# Altium footprint library MiscDevices.PcbLib: 251 footprints (part 8 of 16)
Each footprint in its own frame and in the unit in brackets; x right, y up, seen from the top. Pads: shape width x height; smd on the part's side, far side on the other; paste and mask are expansions set on the pad; w line width, h text height; cw(c..) or ccw(c..) is an arc to the next point about the centre after c.
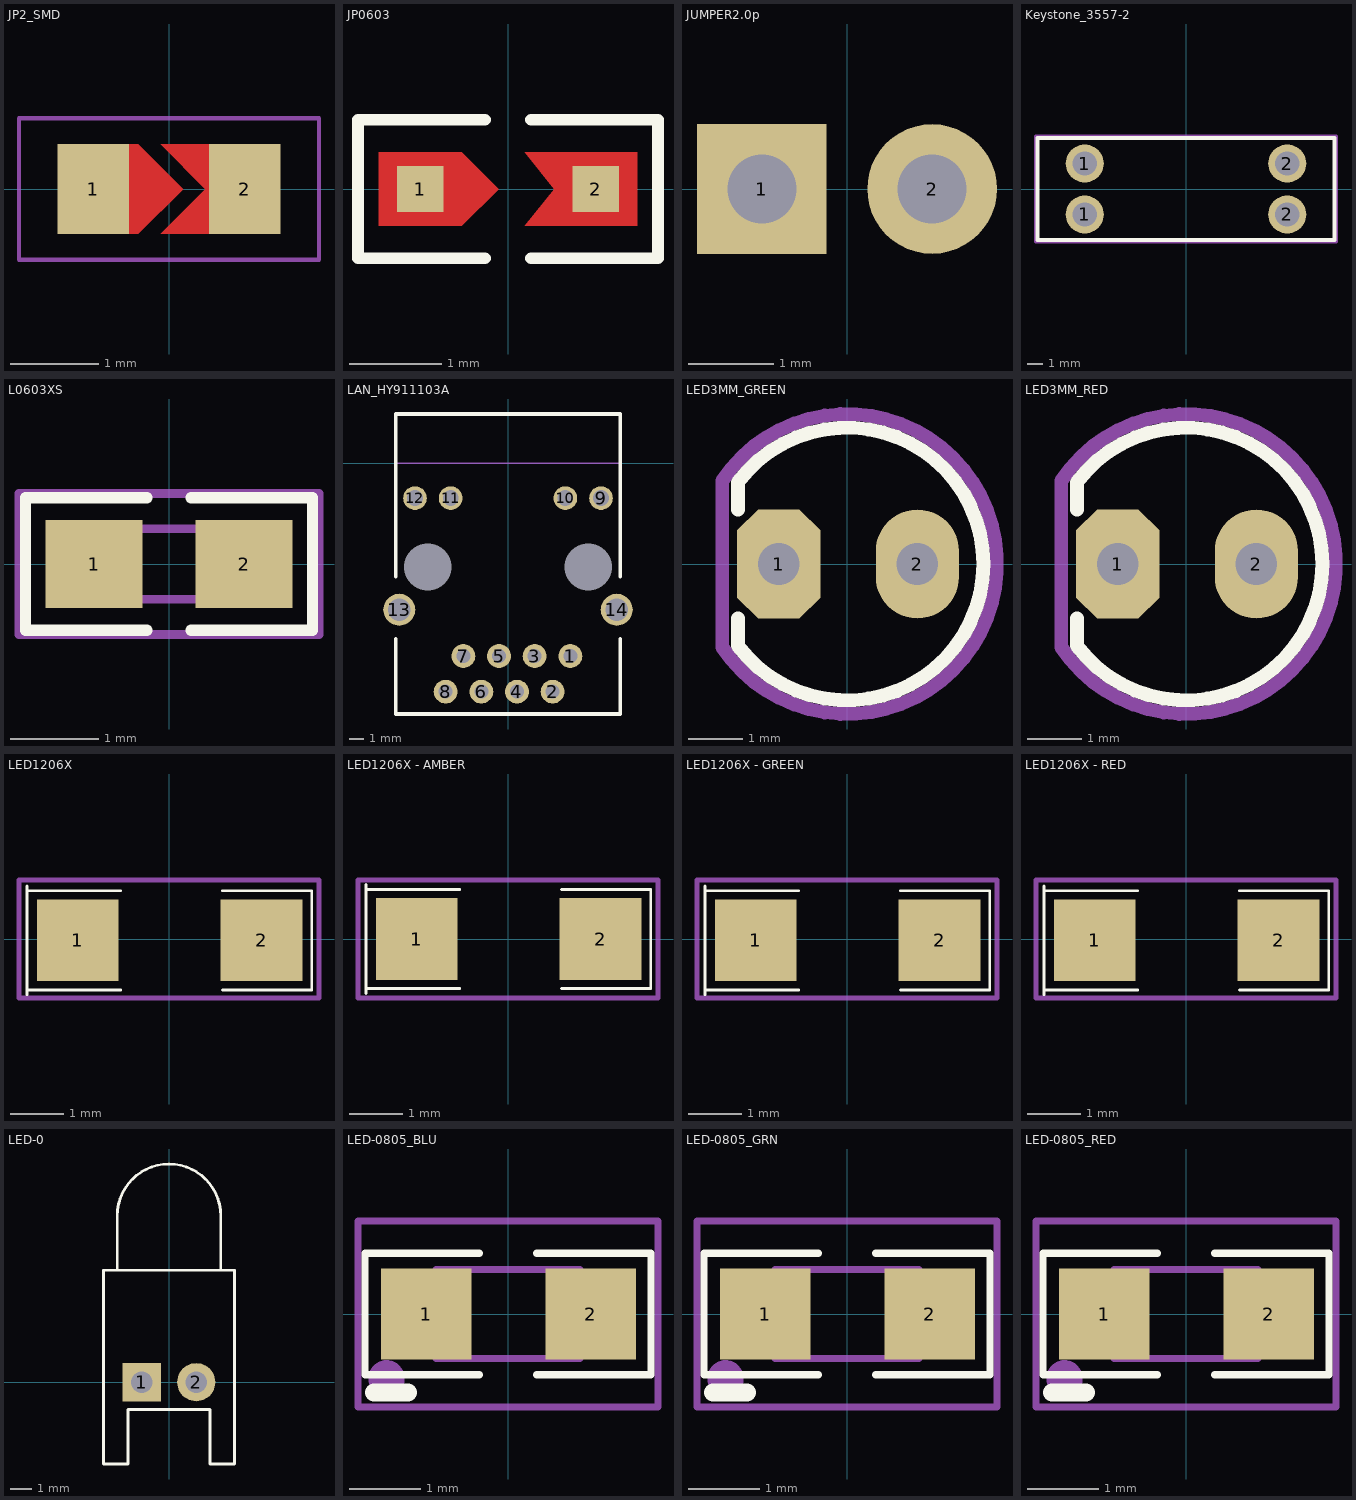
[diagram p7: the footprints below, top view; thin cyan lines are the x and y axes]

## JP2_SMD [mil]
height 78.74
pads (2):
  rect 32x40 smd: 1(-33.75,0) 2(33.75,0)
Top Layer:
  region: 26.25,0 16.25,0 -3.75,20 26.25,20
  region: 26.25,0 16.25,0 -3.75,-20 26.25,-20
  region: -23.75,-20 -13.75,-20 6.25,0 -13.75,20 -23.75,20
Top Paste:
  region: 26.25,0 16.25,0 -3.75,20 26.25,20
  region: 26.25,0 16.25,0 -3.75,-20 26.25,-20
  region: -23.75,-20 -13.75,-20 6.25,0 -13.75,20 -23.75,20
Top Solder:
  region: 26.25,0 12.25,0 -11.75,24 26.25,24
  region: 26.25,0 12.25,0 -11.75,-24 26.25,-24
  region: -23.75,-24 -13.75,-24 10.25,0 -13.75,24 -23.75,24
Top Designator (Mech7):
  text ".Designator" at -299.9,-19.99 h60
Top Courtyard:
  lines w1.97: -66.93,-31.5 -66.93,31.5 66.93,31.5 66.93,-31.5 -66.93,-31.5

## JP0603 [mm] "Jumper Body 1.6 x 0.8 mm (LxW typ)"
height 0.6
pads (2):
  rect 0.5x0.5 smd: 1(-0.95,0)
  rect 0.5x0.5 smd paste+0: 2(0.95,0)
Top Layer:
  region: 0.18,0.4 0.5,0 0.18,-0.4 1.4,-0.4 1.4,0.4
  region: -1.4,0.4 -0.5,0.4 -0.1,0 -0.5,-0.4 -1.4,-0.4
Top Overlay:
  lines w0.127: -0.25,-0.75 -1.625,-0.75 -1.625,0.75 -0.25,0.75 ; 0.25,-0.75 1.625,-0.75 1.625,0.75 0.25,0.75
Top Designator (Mech7):
  text ".Designator" at -7.618,-0.508 h1.52

## JUMPER2.0p [mil] "mini jumper pitch 2.0mm"
pads (2):
  rect 60x60 hole 32.01: 1(-39.37,0)
  round 60 hole 32.01: 2(39.37,0)
Top Designator (Mech7):
  text ".Designator" at -299.91,-21.47 h60
3D body "25975.stp": height 236.22, standoff 100.39, extent -75.79,-39.37 75.79,36.42

## Keystone_3557-2 [mm] "Automotive Fuse Holder 19mmx5mm"
pads (4):
  round 2.54 hole 1.626: 1(-6.75,-1.7) 1(-6.75,1.7) 2(6.75,-1.7) 2(6.75,1.7)
Top Overlay:
  lines w0.254: -9.9,-3.4 9.9,-3.4 9.9,3.4 -9.9,3.4 -9.9,-3.4
Top Designator (Mech7):
  text ".Designator" at -7.618,-0.508 h1.52
Top Courtyard:
  lines w0.254: -10,-3.5 -10,3.5 10,3.5 10,-3.5 -10,-3.5
3D body "keystone-PN3557-2.STEP": height 7.44, standoff -2.72, extent -9.928,-3.348 9.884,3.383

## L0603XS [mm] "Chip Inductor; Body 1.6 x 0.8 mm (LxW typ)"
height 0.6
pads (2):
  rect 1.1x1 smd: 1(-0.85,0) 2(0.85,0)
Top Overlay:
  lines w0.127: -0.25,-0.75 -1.625,-0.75 -1.625,0.75 -0.25,0.75 ; 0.25,-0.75 1.625,-0.75 1.625,0.75 0.25,0.75
Top Designator (Mech7):
  text ".Designator" at -3.809,-0.254 h0.76
Top Assembly:
  lines w0.1: -0.8,-0.4 -0.8,0.4 0.8,0.4 0.8,-0.4 -0.8,-0.4
Top Courtyard:
  lines w0.1: -1.7,-0.8 1.7,-0.8 1.7,0.8 -1.7,0.8 -1.7,-0.8
3D body "rmc1_16-1r0ftp-rl.stp": height 0.45, standoff 0, extent -0.8,-0.4 0.8,0.4

## LAN_HY911103A [mm]
pads (16):
  round 1.7 hole 0.992: 1(4.44,-13.741) 2(3.18,-16.281) 3(1.9,-13.741) 4(0.64,-16.281) 5(-0.64,-13.741) 6(-1.9,-16.281) 7(-3.18,-13.741) 8(-4.44,-16.281)
  round 1.68 hole 1.122: 9(6.625,-2.491) 10(4.085,-2.491) 11(-4.085,-2.491) 12(-6.625,-2.491)
  round 2.286 hole 1.575: 13(-7.745,-10.441) 14(7.745,-10.441)
  round 0 hole 3.352: MH1(-5.715,-7.391) MH2(5.715,-7.391)
Top Overlay:
  lines w0.254: -8,-12.516 -8,-17.869 8,-17.869 8,-12.516 ; -8,-8.101 -8,3.5 8.001,3.5 8,-8.101
Mechanical 1:
  lines w0.1: -8,0 8,0
Top Designator (Mech7):
  text ".Designator" at -7.618,-7.693 h1.52
3D body "User Library-HR911105A.STEP": height 13.51, standoff -2.99, extent -7.94,-17.871 7.94,3.529

## LED3MM_GREEN [mil]
pads (2):
  oct 60x78.74 hole 30: 1(-49.22,0)
  oval 60x78.74 hole 30: 2(50.78,0)
Top Overlay:
  lines w10: -78.74,-39.37 -78.74,-59.06 ccw(c0,0) -78.74,59.06 -78.74,39.37
Top Designator (Mech7):
  text ".Designator" at -299.9,-19.99 h60
Top Courtyard:
  lines w10: -90.08,-60.06 ccw(c0,0) -90.08,60.06 -90.08,-60.06
3D body "everlight-3MM-LED-GREEN.STEP": height 497.5, standoff 2.71, extent -60.08,-74.8 74.8,74.81

## LED3MM_RED [mil]
pads (2):
  oct 60x78.74 hole 30: 1(-49.22,0)
  oval 60x78.74 hole 30: 2(50.78,0)
Top Overlay:
  lines w10: -78.74,-39.37 -78.74,-59.06 ccw(c0,0) -78.74,59.06 -78.74,39.37
Top Designator (Mech7):
  text ".Designator" at -299.9,-19.99 h60
Top Courtyard:
  lines w10: -90.08,-60.06 ccw(c0,0) -90.08,60.06 -90.08,-60.06
3D body "everlight-3MM-LED-RED.STEP": height 497.5, standoff 2.71, extent -60.08,-74.8 74.8,74.81

## LED1206X [mil] "Chip LED 1206;"
pads (2):
  rect 60x60 smd: 1(-67,-1) 2(68,-1)
Top Overlay:
  lines w2: -104.33,-41 -104.33,39 ; -104.33,-37.4 -35.43,-37.4 ; -104.33,35.44 -35.43,35.44 ; 39.37,-37.4 105,-37.4 105,35.44 39.37,35.44
Top Designator (Mech7):
  text ".Designator" at -299.9,-19.99 h60
Top Courtyard:
  lines w3.94: -110.24,-43.31 -110.24,43.31 110.24,43.31 110.24,-43.31 -110.24,-43.31

## LED1206X - AMBER [mil] "Chip LED 1206;"
pads (2):
  rect 60x60 smd: 1(-67,0) 2(68,0)
Top Overlay:
  lines w2: -104.33,-40 -104.33,40 ; -104.33,-36.4 -35.43,-36.4 ; -104.33,36.43 -35.43,36.43 ; 39.37,-36.4 105,-36.4 105,36.43 39.37,36.43
Top Designator (Mech7):
  text ".Designator" at -299.9,-19.99 h60
Top Courtyard:
  lines w3.94: -110.24,-43.31 110.24,-43.31 110.24,43.31 -110.24,43.31 -110.24,-43.31
3D body "SW3dPS-LED1206AMBER.STEP": height 43.81, standoff -15.9, extent -62.05,-30.99 63.95,32.01

## LED1206X - GREEN [mil] "Chip LED 1206;"
pads (2):
  rect 60x60 smd: 1(-67,-1) 2(68,-1)
Top Overlay:
  lines w2: -104.33,-41 -104.33,39 ; -104.33,-37.4 -35.43,-37.4 ; -104.33,35.44 -35.43,35.44 ; 39.37,-37.4 105,-37.4 105,35.44 39.37,35.44
Top Designator (Mech7):
  text ".Designator" at -299.9,-19.99 h60
Top Courtyard:
  lines w3.94: -110.24,-43.31 -110.24,43.31 110.24,43.31 110.24,-43.31 -110.24,-43.31
3D body "SW3dPS-LED1206G.STEP": height 43.81, standoff -15.9, extent -63,-32.49 63,30.51

## LED1206X - RED [mil] "Chip LED 1206;"
pads (2):
  rect 60x60 smd: 1(-67,-1) 2(68,-1)
Top Overlay:
  lines w2: -104.33,-41 -104.33,39 ; -104.33,-37.4 -35.43,-37.4 ; -104.33,35.44 -35.43,35.44 ; 39.37,-37.4 105,-37.4 105,35.44 39.37,35.44
Top Designator (Mech7):
  text ".Designator" at -299.9,-19.99 h60
Top Courtyard:
  lines w3.94: -110.24,-43.31 -110.24,43.31 110.24,43.31 110.24,-43.31 -110.24,-43.31
3D body "SW3dPS-LED1206R.STEP": height 43.81, standoff -15.9, extent -63,-32.49 63,30.51

## LED-0 [mil] "Typical INFRARED GaAs LED; 2 Leads"
pads (2):
  rect 70x70 hole 39.37: 1(-50,0)
  round 70 hole 39.37: 2(50,0)
Top Overlay:
  lines w5: -95,205 -95,305 cw(c0,305) 95,305 95,205 ; -120,-150 -75,-150 -75,-50 75,-50 75,-150 120,-150 120,205 -120,205 -120,-150
Top Designator (Mech7):
  text ".Designator" at -299.9,78.43 h60
3D body "CircuitWorks-5MM LED RED.STEP": height 257.87, standoff 57.09, extent -100.39,-141.73 100.4,393.71

## LED-0805_BLU [mil] "Chip LED0805 ; BLUE"
height 23.62
pads (2):
  rect 50x50 smd: 1(-45,0) 2(45.55,0)
Top Overlay:
  lines w3.94: -15.75,-33.46 -78.74,-33.46 -78.74,33.47 -15.75,33.47 ; 15.75,-33.46 78.74,-33.46 78.74,33.47 15.75,33.47
  lines w10: -73.82,-43.31 -55.12,-43.31
Top Designator (Mech7):
  text ".Designator" at -149.95,-10 h30
Top Assembly:
  lines w3.94: -39.76,-24.6 39.76,-24.6 39.76,24.6 -39.76,24.6 -39.76,-24.6
Top Courtyard:
  circle w10: c-66.93,-35.43 r5
  lines w3.94: -82.68,-51.18 82.68,-51.18 82.68,51.18 -82.68,51.18 -82.68,-51.18
3D body "User Library-LED0805_BLUE.STEP": height 31.5, standoff 0, extent -41.34,-26.58 41.34,26.57

## LED-0805_GRN [mil] "Chip LED0805 ; GREEN"
height 23.62
pads (2):
  rect 50x50 smd: 1(-45,0) 2(45.55,0)
Top Overlay:
  lines w3.94: -15.75,-33.46 -78.74,-33.46 -78.74,33.47 -15.75,33.47 ; 15.75,-33.46 78.74,-33.46 78.74,33.47 15.75,33.47
  lines w10: -73.82,-43.31 -55.12,-43.31
Top Designator (Mech7):
  text ".Designator" at -149.95,-10 h30
Top Assembly:
  lines w3.94: -39.76,-24.6 39.77,-24.6 39.77,24.61 -39.76,24.61 -39.76,-24.6
Top Courtyard:
  circle w10: c-66.93,-35.43 r5
  lines w3.94: -82.68,-51.18 82.68,-51.18 82.68,51.18 -82.68,51.18 -82.68,-51.18
3D body "User Library-User Library-led_0805 GRE.STEP": height 43.31, standoff 0, extent -39.76,-24.61 39.76,24.61

## LED-0805_RED [mil] "Chip LED0805 ; RED"
height 23.62
pads (2):
  rect 50x50 smd: 1(-45,0) 2(45.55,0)
Top Overlay:
  lines w3.94: -15.75,-33.46 -78.74,-33.46 -78.74,33.47 -15.75,33.47 ; 15.75,-33.46 78.74,-33.46 78.74,33.47 15.75,33.47
  lines w10: -73.82,-43.31 -55.12,-43.31
Top Designator (Mech7):
  text ".Designator" at -149.95,-10 h30
Top Assembly:
  lines w3.94: -39.76,-24.6 39.76,-24.6 39.76,24.6 -39.76,24.6 -39.76,-24.6
Top Courtyard:
  circle w10: c-66.93,-35.43 r5
  lines w3.94: -82.68,-51.18 -82.68,51.18 82.68,51.18 82.68,-51.18 -82.68,-51.18
3D body "User Library-led_0805LED0805_red.STEP": height 43.31, standoff 0, extent -39.77,-24.61 39.76,24.6